# Altium schematic symbol library Capacitor - Aluminium TH.SchLib: 4591 symbols (part 19 of 27) (continued)
## UPA1E102MHD3TO (continued)
CAP ALUM 1000UF 20% 25V RADIAL; Part Number: UPA1E102MHD3TO; Manufacturer: Nichicon; TemperatureRange: -55C ~ 105C; Type: Polar; Ripple Current: 1.418A @ 120Hz; Value: 1000uF; PartId: 23201; Supplier 1: Digi-Key; Supplier Part Number 1: 493-4897-3-ND; ComponentLink1Description: Datasheet; ComponentLink1URL: http://nichicon-us.com/english/products/pdfs/e-upa.pdf; ComponentLink2Description: Digi-Key Listing; ComponentLink2URL: https://www.digikey.com/product-detail/en/nichicon/UPA1E102MHD3TO/493-4897-3-ND/3129902; Tolerance: 20%; Voltage: 25V; Price: 0.4627; Device Package: Radial, Can, 12.5mm
footprint CAP AL TH D12.5 L5 H22
pins: 1, 2

## UPA1E102MPD1TD
designator C?, comment 1000uF  (value not drawn)
CAP ALUM 1000UF 20% 25V RADIAL; Part Number: UPA1E102MPD1TD; Manufacturer: Nichicon; TemperatureRange: -55C ~ 105C; Type: Polar; Ripple Current: 1.26A @ 120Hz; Impedance: 33 mOhm; Value: 1000uF; PartId: 26035; Supplier 1: Digi-Key; Supplier Part Number 1: 493-4898-3-ND; ComponentLink1Description: Datasheet; ComponentLink1URL: http://nichicon-us.com/english/products/pdfs/e-upa.pdf; ComponentLink2Description: Digi-Key Listing; ComponentLink2URL: https://www.digikey.com/product-detail/en/nichicon/UPA1E102MPD1TD/493-4898-3-ND/3129903; Tolerance: 20%; Voltage: 25V; Price: 0.4627; Device Package: Radial, Can, 10mm
footprint CAP AL TH D10 L5 H30
pins: 1, 2

## UPA1E122MHD1TO
designator C?, comment 1200uF  (value not drawn)
CAP ALUM 1200UF 20% 25V RADIAL; Part Number: UPA1E122MHD1TO; Manufacturer: Nichicon; TemperatureRange: -55C ~ 105C; Type: Polar; Ripple Current: 1.607A @ 120Hz; Impedance: 29 mOhm; Value: 1200uF; PartId: 23485; Supplier 1: Digi-Key; Supplier Part Number 1: 493-4899-1-ND; ComponentLink1Description: Datasheet; ComponentLink1URL: http://nichicon-us.com/english/products/pdfs/e-upa.pdf; ComponentLink2Description: Digi-Key Listing; ComponentLink2URL: https://www.digikey.com/product-detail/en/nichicon/UPA1E122MHD1TO/493-4899-1-ND/3129236; Tolerance: 20%; Voltage: 25V; Price: 1.16; Device Package: Radial, Can, 12.5mm
footprint CAP AL TH D12.5 L5 H22
pins: 1, 2

## UPA1E182MHD1TO
designator C?, comment 1800uF  (value not drawn)
CAP ALUM 1800UF 20% 25V RADIAL; Part Number: UPA1E182MHD1TO; Manufacturer: Nichicon; TemperatureRange: -55C ~ 105C; Type: Polar; Ripple Current: 1.938A @ 120Hz; Impedance: 22 mOhm; Value: 1800uF; PartId: 23843; Supplier 1: Digi-Key; Supplier Part Number 1: 493-4900-3-ND; ComponentLink1Description: Datasheet; ComponentLink1URL: http://nichicon-us.com/english/products/pdfs/e-upa.pdf; ComponentLink2Description: Digi-Key Listing; ComponentLink2URL: https://www.digikey.com/product-detail/en/nichicon/UPA1E182MHD1TO/493-4900-3-ND/3129905; Tolerance: 20%; Voltage: 25V; Price: 0.5358; Device Package: Radial, Can, 12.5mm
footprint CAP AL TH D12.5 L5 H27
pins: 1, 2

## UPA1E222MHD
designator C?, comment 2200uF  (value not drawn)
CAP ALUM 2200UF 20% 25V RADIAL; Part Number: UPA1E222MHD; Manufacturer: Nichicon; TemperatureRange: -55C ~ 105C; Type: Polar; Ripple Current: 2.312A @ 120Hz; Impedance: 18 mOhm; Value: 2200uF; PartId: 24366; Supplier 1: Digi-Key; Supplier Part Number 1: 493-5433-ND; ComponentLink1Description: Datasheet; ComponentLink1URL: http://nichicon-us.com/english/products/pdfs/e-upa.pdf; ComponentLink2Description: Digi-Key Listing; ComponentLink2URL: https://www.digikey.com/product-detail/en/nichicon/UPA1E222MHD/493-5433-ND/3130438; Tolerance: 20%; Voltage: 25V; Price: 1.56; Device Package: Radial, Can, 12.5mm
footprint CAP AL TH D12.5 L5 H35.5
pins: 1, 2

## UPA1E222MHD6TN
designator C?, comment 2200uF  (value not drawn)
CAP ALUM 2200UF 20% 25V RADIAL; Part Number: UPA1E222MHD6TN; Manufacturer: Nichicon; TemperatureRange: -55C ~ 105C; Type: Polar; Ripple Current: 1.981A @ 120Hz; Impedance: 26 mOhm; Value: 2200uF; PartId: 26400; Supplier 1: Digi-Key; Supplier Part Number 1: 493-4901-3-ND; ComponentLink1Description: Datasheet; ComponentLink1URL: http://nichicon-us.com/english/products/pdfs/e-upa.pdf; ComponentLink2Description: Digi-Key Listing; ComponentLink2URL: https://www.digikey.com/product-detail/en/nichicon/UPA1E222MHD6TN/493-4901-3-ND/3129906; Tolerance: 20%; Voltage: 25V; Price: 0.9222; Device Package: Radial, Can, 16mm
footprint CAP AL TH D16 L7.5 H22
pins: 1, 2

## UPA1E332MHD1TN
designator C?, comment 3300uF  (value not drawn)
CAP ALUM 3300UF 20% 25V RADIAL; Part Number: UPA1E332MHD1TN; Manufacturer: Nichicon; TemperatureRange: -55C ~ 105C; Type: Polar; Ripple Current: 2.346A @ 120Hz; Impedance: 19 mOhm; Value: 3300uF; PartId: 26832; Supplier 1: Digi-Key; Supplier Part Number 1: 493-4904-3-ND; ComponentLink1Description: Datasheet; ComponentLink1URL: http://nichicon-us.com/english/products/pdfs/e-upa.pdf; ComponentLink2Description: Digi-Key Listing; ComponentLink2URL: https://www.digikey.com/product-detail/en/nichicon/UPA1E332MHD1TN/493-4904-3-ND/3129909; Tolerance: 20%; Voltage: 25V; Price: 0.9801; Device Package: Radial, Can, 16mm
footprint CAP AL TH D16 L7.5 H27
pins: 1, 2

## UPA1E471MPD6TD
designator C?, comment 470uF  (value not drawn)
CAP ALUM 470UF 20% 25V RADIAL; Part Number: UPA1E471MPD6TD; Manufacturer: Nichicon; TemperatureRange: -55C ~ 105C; Type: Polar; Ripple Current: 675mA @ 120Hz; Impedance: 63 mOhm; Value: 470uF; PartId: 24658; Supplier 1: Digi-Key; Supplier Part Number 1: 493-4907-3-ND; ComponentLink1Description: Datasheet; ComponentLink1URL: http://nichicon-us.com/english/products/pdfs/e-upa.pdf; ComponentLink2Description: Digi-Key Listing; ComponentLink2URL: https://www.digikey.com/product-detail/en/nichicon/UPA1E471MPD6TD/493-4907-3-ND/3129912; Tolerance: 20%; Voltage: 25V; Price: 0.2587; Device Package: Radial, Can, 10mm
footprint CAP AL TH D10 L5 H14.5
pins: 1, 2

## UPA1E561MPD6TD
designator C?, comment 560uF  (value not drawn)
CAP ALUM 560UF 20% 25V RADIAL; Part Number: UPA1E561MPD6TD; Manufacturer: Nichicon; TemperatureRange: -55C ~ 105C; Type: Polar; Ripple Current: 930mA @ 120Hz; Impedance: 49 mOhm; Value: 560uF; PartId: 25119; Supplier 1: Digi-Key; Supplier Part Number 1: 493-4910-3-ND; ComponentLink1Description: Datasheet; ComponentLink1URL: http://nichicon-us.com/english/products/pdfs/e-upa.pdf; ComponentLink2Description: Digi-Key Listing; ComponentLink2URL: https://www.digikey.com/product-detail/en/nichicon/UPA1E561MPD6TD/493-4910-3-ND/3129915; Tolerance: 20%; Voltage: 25V; Price: 0.3241; Device Package: Radial, Can, 10mm
footprint CAP AL TH D10 L5 H17.5
pins: 1, 2

## UPA1E681MPD1TD
designator C?, comment 680uF  (value not drawn)
CAP ALUM 680UF 20% 25V RADIAL; Part Number: UPA1E681MPD1TD; Manufacturer: Nichicon; TemperatureRange: -55C ~ 105C; Type: Polar; Ripple Current: 930mA @ 120Hz; Impedance: 49 mOhm; Value: 680uF; PartId: 25106; Supplier 1: Digi-Key; Supplier Part Number 1: 493-4911-3-ND; ComponentLink1Description: Datasheet; ComponentLink1URL: http://nichicon-us.com/english/products/pdfs/e-upa.pdf; ComponentLink2Description: Digi-Key Listing; ComponentLink2URL: https://www.digikey.com/product-detail/en/nichicon/UPA1E681MPD1TD/493-4911-3-ND/3129916; Tolerance: 20%; Voltage: 25V; Price: 0.2945; Device Package: Radial, Can, 10mm
footprint CAP AL TH D10 L5 H17.5
pins: 1, 2

## UPA1E821MPD1TD
designator C?, comment 820uF  (value not drawn)
CAP ALUM 820UF 20% 25V RADIAL; Part Number: UPA1E821MPD1TD; Manufacturer: Nichicon; TemperatureRange: -55C ~ 105C; Type: Polar; Ripple Current: 1.118A @ 120Hz; Impedance: 35 mOhm; Value: 820uF; PartId: 25827; Supplier 1: Digi-Key; Supplier Part Number 1: 493-4912-3-ND; ComponentLink1Description: Datasheet; ComponentLink1URL: http://nichicon-us.com/english/products/pdfs/e-upa.pdf; ComponentLink2Description: Digi-Key Listing; ComponentLink2URL: https://www.digikey.com/product-detail/en/nichicon/UPA1E821MPD1TD/493-4912-3-ND/3129917; Tolerance: 20%; Voltage: 25V; Price: 0.3447; Device Package: Radial, Can, 10mm
footprint CAP AL TH D10 L5 H22
pins: 1, 2

## UPA1V102MHD1TO
designator C?, comment 1000uF  (value not drawn)
CAP ALUM 1000UF 20% 35V RADIAL; Part Number: UPA1V102MHD1TO; Manufacturer: Nichicon; TemperatureRange: -55C ~ 105C; Type: Polar; Ripple Current: 1.418A @ 120Hz; Impedance: 29 mOhm; Value: 1000uF; PartId: 23205; Supplier 1: Digi-Key; Supplier Part Number 1: 493-4913-3-ND; ComponentLink1Description: Datasheet; ComponentLink1URL: http://nichicon-us.com/english/products/pdfs/e-upa.pdf; ComponentLink2Description: Digi-Key Listing; ComponentLink2URL: https://www.digikey.com/product-detail/en/nichicon/UPA1V102MHD1TO/493-4913-3-ND/3129918; Tolerance: 20%; Voltage: 35V; Price: 0.4945; Device Package: Radial, Can, 12.5mm
footprint CAP AL TH D12.5 L5 H22
pins: 1, 2

## UPA1V122MHD1TO
designator C?, comment 1200uF  (value not drawn)
CAP ALUM 1200UF 20% 35V RADIAL; Part Number: UPA1V122MHD1TO; Manufacturer: Nichicon; TemperatureRange: -55C ~ 105C; Type: Polar; Ripple Current: 1.938A @ 120Hz; Impedance: 22 mOhm; Value: 1200uF; PartId: 23846; Supplier 1: Digi-Key; Supplier Part Number 1: 493-4914-3-ND; ComponentLink1Description: Datasheet; ComponentLink1URL: http://nichicon-us.com/english/products/pdfs/e-upa.pdf; ComponentLink2Description: Digi-Key Listing; ComponentLink2URL: https://www.digikey.com/product-detail/en/nichicon/UPA1V122MHD1TO/493-4914-3-ND/3129919; Tolerance: 20%; Voltage: 35V; Price: 0.5584; Device Package: Radial, Can, 12.5mm
footprint CAP AL TH D12.5 L5 H27
pins: 1, 2

## UPA1V152MHD
designator C?, comment 1500uF  (value not drawn)
CAP ALUM 1500UF 20% 35V RADIAL; Part Number: UPA1V152MHD; Manufacturer: Nichicon; TemperatureRange: -55C ~ 105C; Type: Polar; Ripple Current: 2.312A @ 120Hz; Impedance: 18 mOhm; Value: 1500uF; PartId: 24364; Supplier 1: Digi-Key; Supplier Part Number 1: 493-5435-ND; ComponentLink1Description: Datasheet; ComponentLink1URL: http://nichicon-us.com/english/products/pdfs/e-upa.pdf; ComponentLink2Description: Digi-Key Listing; ComponentLink2URL: https://www.digikey.com/product-detail/en/nichicon/UPA1V152MHD/493-5435-ND/3130440; Tolerance: 20%; Voltage: 35V; Price: 1.56; Device Package: Radial, Can, 12.5mm
footprint CAP AL TH D12.5 L5 H35.5
pins: 1, 2

## UPA1V222MHD1TN
designator C?, comment 2200uF  (value not drawn)
CAP ALUM 2200UF 20% 35V RADIAL; Part Number: UPA1V222MHD1TN; Manufacturer: Nichicon; TemperatureRange: -55C ~ 105C; Type: Polar; Ripple Current: 2.346A @ 120Hz; Impedance: 19 mOhm; Value: 2200uF; PartId: 26843; Supplier 1: Digi-Key; Supplier Part Number 1: 493-4917-3-ND; ComponentLink1Description: Datasheet; ComponentLink1URL: http://nichicon-us.com/english/products/pdfs/e-upa.pdf; ComponentLink2Description: Digi-Key Listing; ComponentLink2URL: https://www.digikey.com/product-detail/en/nichicon/UPA1V222MHD1TN/493-4917-3-ND/3129922; Tolerance: 20%; Voltage: 35V; Price: 1.0285; Device Package: Radial, Can, 16mm
footprint CAP AL TH D16 L7.5 H27
pins: 1, 2

## UPA1V271MPD6TD
designator C?, comment 270uF  (value not drawn)
CAP ALUM 270UF 20% 35V RADIAL; Part Number: UPA1V271MPD6TD; Manufacturer: Nichicon; TemperatureRange: -55C ~ 105C; Type: Polar; Ripple Current: 585mA @ 120Hz; Impedance: 63 mOhm; Value: 270uF; PartId: 24656; Supplier 1: Digi-Key; Supplier Part Number 1: 493-4920-3-ND; ComponentLink1Description: Datasheet; ComponentLink1URL: http://nichicon-us.com/english/products/pdfs/e-upa.pdf; ComponentLink2Description: Digi-Key Listing; ComponentLink2URL: https://www.digikey.com/product-detail/en/nichicon/UPA1V271MPD6TD/493-4920-3-ND/3129925; Tolerance: 20%; Voltage: 35V; Price: 0.2572; Device Package: Radial, Can, 10mm
footprint CAP AL TH D10 L5 H14.5
pins: 1, 2

## UPA1V272MHD
designator C?, comment 2700uF  (value not drawn)
CAP ALUM 2700UF 20% 35V RADIAL; Part Number: UPA1V272MHD; Manufacturer: Nichicon; TemperatureRange: -55C ~ 105C; Type: Polar; Ripple Current: 2.389A @ 120Hz; Impedance: 17 mOhm; Value: 2700uF; PartId: 27218; Supplier 1: Digi-Key; Supplier Part Number 1: 493-5437-ND; ComponentLink1Description: Datasheet; ComponentLink1URL: http://nichicon-us.com/english/products/pdfs/e-upa.pdf; ComponentLink2Description: Digi-Key Listing; ComponentLink2URL: https://www.digikey.com/product-detail/en/nichicon/UPA1V272MHD/493-5437-ND/3130442; Tolerance: 20%; Voltage: 35V; Price: 2.31; Device Package: Radial, Can, 16mm
footprint CAP AL TH D16 L7.5 H33.5
pins: 1, 2

## UPA1V391MPD6TD
designator C?, comment 390uF  (value not drawn)
CAP ALUM 390UF 20% 35V RADIAL; Part Number: UPA1V391MPD6TD; Manufacturer: Nichicon; TemperatureRange: -55C ~ 105C; Type: Polar; Ripple Current: 930mA @ 120Hz; Impedance: 49 mOhm; Value: 390uF; PartId: 25104; Supplier 1: Digi-Key; Supplier Part Number 1: 493-4923-3-ND; ComponentLink1Description: Datasheet; ComponentLink1URL: http://nichicon-us.com/english/products/pdfs/e-upa.pdf; ComponentLink2Description: Digi-Key Listing; ComponentLink2URL: https://www.digikey.com/product-detail/en/nichicon/UPA1V391MPD6TD/493-4923-3-ND/3129928; Tolerance: 20%; Voltage: 35V; Price: 0.2945; Device Package: Radial, Can, 10mm
footprint CAP AL TH D10 L5 H17.5
pins: 1, 2

## UPA1V561MPD1TD
designator C?, comment 560uF  (value not drawn)
CAP ALUM 560UF 20% 35V RADIAL; Part Number: UPA1V561MPD1TD; Manufacturer: Nichicon; TemperatureRange: -55C ~ 105C; Type: Polar; Ripple Current: 1.118A @ 120Hz; Impedance: 35 mOhm; Value: 560uF; PartId: 25826; Supplier 1: Digi-Key; Supplier Part Number 1: 493-4924-3-ND; ComponentLink1Description: Datasheet; ComponentLink1URL: http://nichicon-us.com/english/products/pdfs/e-upa.pdf; ComponentLink2Description: Digi-Key Listing; ComponentLink2URL: https://www.digikey.com/product-detail/en/nichicon/UPA1V561MPD1TD/493-4924-3-ND/3129929; Tolerance: 20%; Voltage: 35V; Price: 0.3447; Device Package: Radial, Can, 10mm
footprint CAP AL TH D10 L5 H22
pins: 1, 2

## UPA1V681MPD1TD
designator C?, comment 680uF  (value not drawn)
CAP ALUM 680UF 20% 35V RADIAL; Part Number: UPA1V681MPD1TD; Manufacturer: Nichicon; TemperatureRange: -55C ~ 105C; Type: Polar; Ripple Current: 1.26A @ 120Hz; Impedance: 33 mOhm; Value: 680uF; PartId: 26026; Supplier 1: Digi-Key; Supplier Part Number 1: 493-4925-3-ND; ComponentLink1Description: Datasheet; ComponentLink1URL: http://nichicon-us.com/english/products/pdfs/e-upa.pdf; ComponentLink2Description: Digi-Key Listing; ComponentLink2URL: https://www.digikey.com/product-detail/en/nichicon/UPA1V681MPD1TD/493-4925-3-ND/3129930; Tolerance: 20%; Voltage: 35V; Price: 0.4017; Device Package: Radial, Can, 10mm
footprint CAP AL TH D10 L5 H30
pins: 1, 2

## UPA1V821MHD1TO
designator C?, comment 820uF  (value not drawn)
CAP ALUM 820UF 20% 35V RADIAL; Part Number: UPA1V821MHD1TO; Manufacturer: Nichicon; TemperatureRange: -55C ~ 105C; Type: Polar; Ripple Current: 1.418A @ 120Hz; Impedance: 29 mOhm; Value: 820uF; PartId: 23200; Supplier 1: Digi-Key; Supplier Part Number 1: 493-4926-3-ND; ComponentLink1Description: Datasheet; ComponentLink1URL: http://nichicon-us.com/english/products/pdfs/e-upa.pdf; ComponentLink2Description: Digi-Key Listing; ComponentLink2URL: https://www.digikey.com/product-detail/en/nichicon/UPA1V821MHD1TO/493-4926-3-ND/3129931; Tolerance: 20%; Voltage: 35V; Price: 0.4627; Device Package: Radial, Can, 12.5mm
footprint CAP AL TH D12.5 L5 H22
pins: 1, 2

## UPJ0J102MHD6TO
designator C?, comment 1000uF  (value not drawn)
CAP ALUM 1000UF 20% 6.3V RADIAL; Part Number: UPJ0J102MHD6TO; Manufacturer: Nichicon; TemperatureRange: -55C ~ 105C; Type: Polar; Ripple Current: 765mA @ 120Hz; Impedance: 130 mOhm; Value: 1000uF; PartId: 22724; Supplier 1: Digi-Key; Supplier Part Number 1: 493-11914-1-ND; ComponentLink1Description: Datasheet; ComponentLink1URL: http://nichicon-us.com/english/products/pdfs/e-upj.pdf; ComponentLink2Description: Digi-Key Listing; ComponentLink2URL: https://www.digikey.com/product-detail/en/nichicon/UPJ0J102MHD6TO/493-11914-1-ND/4319393; Tolerance: 20%; Voltage: 6.3V; Price: 0; Device Package: Radial, Can, 12.5mm
footprint CAP AL TH D12.5 L5 H16.5
pins: 1, 2

## UPJ0J122MHD6TO
designator C?, comment 1200uF  (value not drawn)
CAP ALUM 1200UF 20% 6.3V RADIAL; Part Number: UPJ0J122MHD6TO; Manufacturer: Nichicon; TemperatureRange: -55C ~ 105C; Type: Polar; Ripple Current: 835mA @ 120Hz; Impedance: 120 mOhm; Value: 1200uF; PartId: 22730; Supplier 1: Digi-Key; Supplier Part Number 1: 493-4970-1-ND; ComponentLink1Description: Datasheet; ComponentLink1URL: http://nichicon-us.com/english/products/pdfs/e-upj.pdf; ComponentLink2Description: Digi-Key Listing; ComponentLink2URL: https://www.digikey.com/product-detail/en/nichicon/UPJ0J122MHD6TO/493-4970-1-ND/3129307; Tolerance: 20%; Voltage: 6.3V; Price: 0; Device Package: Radial, Can, 12.5mm
footprint CAP AL TH D12.5 L5 H16.5
pins: 1, 2

## UPJ0J152MHD6TO
designator C?, comment 1500uF  (value not drawn)
CAP ALUM 1500UF 20% 6.3V RADIAL; Part Number: UPJ0J152MHD6TO; Manufacturer: Nichicon; TemperatureRange: -55C ~ 105C; Type: Polar; Ripple Current: 915mA @ 120Hz; Impedance: 100 mOhm; Value: 1500uF; PartId: 22750; Supplier 1: Digi-Key; Supplier Part Number 1: 493-4973-1-ND; ComponentLink1Description: Datasheet; ComponentLink1URL: http://nichicon-us.com/english/products/pdfs/e-upj.pdf; ComponentLink2Description: Digi-Key Listing; ComponentLink2URL: https://www.digikey.com/product-detail/en/nichicon/UPJ0J152MHD6TO/493-4973-1-ND/3129310; Tolerance: 20%; Voltage: 6.3V; Price: 0; Device Package: Radial, Can, 12.5mm
footprint CAP AL TH D12.5 L5 H16.5
pins: 1, 2

## UPJ0J152MPD
designator C?, comment 1500uF  (value not drawn)
CAP ALUM 1500UF 20% 6.3V RADIAL; Part Number: UPJ0J152MPD; Manufacturer: Nichicon; TemperatureRange: -55C ~ 105C; Type: Polar; Ripple Current: 1.09A @ 120Hz; Impedance: 84 mOhm; Value: 1500uF; PartId: 26059; Supplier 1: Digi-Key; Supplier Part Number 1: 493-14368-ND; ComponentLink1Description: Datasheet; ComponentLink1URL: http://nichicon-us.com/english/products/pdfs/e-upj.pdf; ComponentLink2Description: Digi-Key Listing; ComponentLink2URL: https://www.digikey.com/product-detail/en/nichicon/UPJ0J152MPD/493-14368-ND/2599000; Tolerance: 20%; Voltage: 6.3V; Price: 0.67; Device Package: Radial, Can, 10mm
footprint CAP AL TH D10 L5 H30
pins: 1, 2

## UPJ0J182MHD6TN
designator C?, comment 1800uF  (value not drawn)
CAP ALUM 1800UF 20% 6.3V RADIAL; Part Number: UPJ0J182MHD6TN; Manufacturer: Nichicon; TemperatureRange: -55C ~ 105C; Type: Polar; Ripple Current: 1.14A @ 120Hz; Impedance: 84 mOhm; Value: 1800uF; PartId: 26230; Supplier 1: Digi-Key; Supplier Part Number 1: 493-4974-3-ND; ComponentLink1Description: Datasheet; ComponentLink1URL: http://nichicon-us.com/english/products/pdfs/e-upj.pdf; ComponentLink2Description: Digi-Key Listing; ComponentLink2URL: https://www.digikey.com/product-detail/en/nichicon/UPJ0J182MHD6TN/493-4974-3-ND/3129979; Tolerance: 20%; Voltage: 6.3V; Price: 0.3876; Device Package: Radial, Can, 16mm
footprint CAP AL TH D16 L7.5 H16.5
pins: 1, 2

## UPJ0J222MHD6TN
designator C?, comment 2200uF  (value not drawn)
CAP ALUM 2200UF 20% 6.3V RADIAL; Part Number: UPJ0J222MHD6TN; Manufacturer: Nichicon; TemperatureRange: -55C ~ 105C; Type: Polar; Ripple Current: 1.2A @ 120Hz; Impedance: 78 mOhm; Value: 2200uF; PartId: 26234; Supplier 1: Digi-Key; Supplier Part Number 1: 493-4975-3-ND; ComponentLink1Description: Datasheet; ComponentLink1URL: http://nichicon-us.com/english/products/pdfs/e-upj.pdf; ComponentLink2Description: Digi-Key Listing; ComponentLink2URL: https://www.digikey.com/product-detail/en/nichicon/UPJ0J222MHD6TN/493-4975-3-ND/3129980; Tolerance: 20%; Voltage: 6.3V; Price: 0.4095; Device Package: Radial, Can, 16mm
footprint CAP AL TH D16 L7.5 H16.5
pins: 1, 2

## UPJ0J272MHD1TO
designator C?, comment 2700uF  (value not drawn)
CAP ALUM 2700UF 20% 6.3V RADIAL; Part Number: UPJ0J272MHD1TO; Manufacturer: Nichicon; TemperatureRange: -55C ~ 105C; Type: Polar; Ripple Current: 1.43A @ 120Hz; Impedance: 51 mOhm; Value: 2700uF; PartId: 23623; Supplier 1: Digi-Key; Supplier Part Number 1: 493-4976-3-ND; ComponentLink1Description: Datasheet; ComponentLink1URL: http://nichicon-us.com/english/products/pdfs/e-upj.pdf; ComponentLink2Description: Digi-Key Listing; ComponentLink2URL: https://www.digikey.com/product-detail/en/nichicon/UPJ0J272MHD1TO/493-4976-3-ND/3129981; Tolerance: 20%; Voltage: 6.3V; Price: 0.3389; Device Package: Radial, Can, 12.5mm
footprint CAP AL TH D12.5 L5 H26.5
pins: 1, 2

## UPJ0J332MHD1TO
designator C?, comment 3300uF  (value not drawn)
CAP ALUM 3300UF 20% 6.3V RADIAL; Part Number: UPJ0J332MHD1TO; Manufacturer: Nichicon; TemperatureRange: -55C ~ 105C; Type: Polar; Ripple Current: 1.53A @ 120Hz; Impedance: 45 mOhm; Value: 3300uF; PartId: 23942; Supplier 1: Digi-Key; Supplier Part Number 1: 493-12101-1-ND; ComponentLink1Description: Datasheet; ComponentLink1URL: http://nichicon-us.com/english/products/pdfs/e-upj.pdf; ComponentLink2Description: Digi-Key Listing; ComponentLink2URL: https://www.digikey.com/product-detail/en/nichicon/UPJ0J332MHD1TO/493-12101-1-ND/4319400; Tolerance: 20%; Voltage: 6.3V; Price: 0.97; Device Package: Radial, Can, 12.5mm
footprint CAP AL TH D12.5 L5 H27
pins: 1, 2

## UPJ0J392MHD
designator C?, comment 3900uF  (value not drawn)
CAP ALUM 3900UF 20% 6.3V RADIAL; Part Number: UPJ0J392MHD; Manufacturer: Nichicon; TemperatureRange: -55C ~ 105C; Type: Polar; Ripple Current: 1.71A @ 120Hz; Impedance: 37 mOhm; Value: 3900uF; PartId: 24202; Supplier 1: Digi-Key; Supplier Part Number 1: 493-5514-ND; ComponentLink1Description: Datasheet; ComponentLink1URL: http://nichicon-us.com/english/products/pdfs/e-upj.pdf; ComponentLink2Description: Digi-Key Listing; ComponentLink2URL: https://www.digikey.com/product-detail/en/nichicon/UPJ0J392MHD/493-5514-ND/2599015; Tolerance: 20%; Voltage: 6.3V; Price: 0.89; Device Package: Radial, Can, 12.5mm
footprint CAP AL TH D12.5 L5 H35.5
pins: 1, 2

## UPJ0J392MHD6TN
designator C?, comment 3900uF  (value not drawn)
CAP ALUM 3900UF 20% 6.3V RADIAL; Part Number: UPJ0J392MHD6TN; Manufacturer: Nichicon; TemperatureRange: -55C ~ 105C; Type: Polar; Ripple Current: 1.54A @ 120Hz; Impedance: 56 mOhm; Value: 3900uF; PartId: 26357; Supplier 1: Digi-Key; Supplier Part Number 1: 493-4979-3-ND; ComponentLink1Description: Datasheet; ComponentLink1URL: http://nichicon-us.com/english/products/pdfs/e-upj.pdf; ComponentLink2Description: Digi-Key Listing; ComponentLink2URL: https://www.digikey.com/product-detail/en/nichicon/UPJ0J392MHD6TN/493-4979-3-ND/3129984; Tolerance: 20%; Voltage: 6.3V; Price: 0.5151; Device Package: Radial, Can, 16mm
footprint CAP AL TH D16 L7.5 H22
pins: 1, 2

## UPJ0J471MPD6TD
designator C?, comment 470uF  (value not drawn)
CAP ALUM 470UF 20% 6.3V RADIAL; Part Number: UPJ0J471MPD6TD; Manufacturer: Nichicon; TemperatureRange: -55C ~ 105C; Type: Polar; Ripple Current: 455mA @ 120Hz; Impedance: 230 mOhm; Value: 470uF; PartId: 24503; Supplier 1: Digi-Key; Supplier Part Number 1: 493-4980-3-ND; ComponentLink1Description: Datasheet; ComponentLink1URL: http://nichicon-us.com/english/products/pdfs/e-upj.pdf; ComponentLink2Description: Digi-Key Listing; ComponentLink2URL: https://www.digikey.com/product-detail/en/nichicon/UPJ0J471MPD6TD/493-4980-3-ND/3129985; Tolerance: 20%; Voltage: 6.3V; Price: 0.1149; Device Package: Radial, Can, 10mm
footprint CAP AL TH D10 L5 H14.5
pins: 1, 2

## UPJ0J561MPD6TD
designator C?, comment 560uF  (value not drawn)
CAP ALUM 560UF 20% 6.3V RADIAL; Part Number: UPJ0J561MPD6TD; Manufacturer: Nichicon; TemperatureRange: -55C ~ 105C; Type: Polar; Ripple Current: 485mA @ 120Hz; Impedance: 210 mOhm; Value: 560uF; PartId: 24791; Supplier 1: Digi-Key; Supplier Part Number 1: 493-4983-1-ND; ComponentLink1Description: Datasheet; ComponentLink1URL: http://nichicon-us.com/english/products/pdfs/e-upj.pdf; ComponentLink2Description: Digi-Key Listing; ComponentLink2URL: https://www.digikey.com/product-detail/en/nichicon/UPJ0J561MPD6TD/493-4983-1-ND/3129320; Tolerance: 20%; Voltage: 6.3V; Price: 0.44; Device Package: Radial, Can, 10mm
footprint CAP AL TH D10 L5 H14.5
pins: 1, 2

## UPJ0J681MPD6TD
designator C?, comment 680uF  (value not drawn)
CAP ALUM 680UF 20% 6.3V RADIAL; Part Number: UPJ0J681MPD6TD; Manufacturer: Nichicon; TemperatureRange: -55C ~ 105C; Type: Polar; Ripple Current: 580mA @ 120Hz; Impedance: 180 mOhm; Value: 680uF; PartId: 24990; Supplier 1: Digi-Key; Supplier Part Number 1: 493-4986-3-ND; ComponentLink1Description: Datasheet; ComponentLink1URL: http://nichicon-us.com/english/products/pdfs/e-upj.pdf; ComponentLink2Description: Digi-Key Listing; ComponentLink2URL: https://www.digikey.com/product-detail/en/nichicon/UPJ0J681MPD6TD/493-4986-3-ND/3129991; Tolerance: 20%; Voltage: 6.3V; Price: 0.1251; Device Package: Radial, Can, 10mm
footprint CAP AL TH D10 L5 H17.5
pins: 1, 2

## UPJ0J682MHD
designator C?, comment 6800uF  (value not drawn)
CAP ALUM 6800UF 20% 6.3V RADIAL; Part Number: UPJ0J682MHD; Manufacturer: Nichicon; TemperatureRange: -55C ~ 105C; Type: Polar; Ripple Current: 2.13A @ 120Hz; Impedance: 29 mOhm; Value: 6800uF; PartId: 26986; Supplier 1: Digi-Key; Supplier Part Number 1: 493-5516-ND; ComponentLink1Description: Datasheet; ComponentLink1URL: http://nichicon-us.com/english/products/pdfs/e-upj.pdf; ComponentLink2Description: Digi-Key Listing; ComponentLink2URL: https://www.digikey.com/product-detail/en/nichicon/UPJ0J682MHD/493-5516-ND/2599027; Tolerance: 20%; Voltage: 6.3V; Price: 1.25; Device Package: Radial, Can, 16mm
footprint CAP AL TH D16 L7.5 H33.5
pins: 1, 2

## UPJ0J822MHD
designator C?, comment 8200uF  (value not drawn)
CAP ALUM 8200UF 20% 6.3V RADIAL; Part Number: UPJ0J822MHD; Manufacturer: Nichicon; TemperatureRange: -55C ~ 105C; Type: Polar; Ripple Current: 2.29A @ 120Hz; Impedance: 27 mOhm; Value: 8200uF; PartId: 27316; Supplier 1: Digi-Key; Supplier Part Number 1: 493-5517-ND; ComponentLink1Description: Datasheet; ComponentLink1URL: http://nichicon-us.com/english/products/pdfs/e-upj.pdf; ComponentLink2Description: Digi-Key Listing; ComponentLink2URL: https://www.digikey.com/product-detail/en/nichicon/UPJ0J822MHD/493-5517-ND/2599031; Tolerance: 20%; Voltage: 6.3V; Price: 1.47; Device Package: Radial, Can, 16mm
footprint CAP AL TH D16 L7.5 H37
pins: 1, 2

## UPJ1A102MHD6TO
designator C?, comment 1000uF  (value not drawn)
CAP ALUM 1000UF 20% 10V RADIAL; Part Number: UPJ1A102MHD6TO; Manufacturer: Nichicon; TemperatureRange: -55C ~ 105C; Type: Polar; Ripple Current: 895mA @ 120Hz; Impedance: 100 mOhm; Value: 1000uF; PartId: 22742; Supplier 1: Digi-Key; Supplier Part Number 1: 493-4988-1-ND; ComponentLink1Description: Datasheet; ComponentLink1URL: http://nichicon-us.com/english/products/pdfs/e-upj.pdf; ComponentLink2Description: Digi-Key Listing; ComponentLink2URL: https://www.digikey.com/product-detail/en/nichicon/UPJ1A102MHD6TO/493-4988-1-ND/3129325; Tolerance: 20%; Voltage: 10V; Price: 0; Device Package: Radial, Can, 12.5mm
footprint CAP AL TH D12.5 L5 H16.5
pins: 1, 2

## UPJ1A102MPD1TD
designator C?, comment 1000uF  (value not drawn)
CAP ALUM 1000UF 20% 10V RADIAL; Part Number: UPJ1A102MPD1TD; Manufacturer: Nichicon; TemperatureRange: -55C ~ 105C; Type: Polar; Ripple Current: 915mA @ 120Hz; Impedance: 96 mOhm; Value: 1000uF; PartId: 25731; Supplier 1: Digi-Key; Supplier Part Number 1: 493-11861-3-ND; ComponentLink1Description: Datasheet; ComponentLink1URL: http://nichicon-us.com/english/products/pdfs/e-upj.pdf; ComponentLink2Description: Digi-Key Listing; ComponentLink2URL: https://www.digikey.com/product-detail/en/nichicon/UPJ1A102MPD1TD/493-11861-3-ND/4321004; Tolerance: 20%; Voltage: 10V; Price: 0.1718; Device Package: Radial, Can, 10mm
footprint CAP AL TH D10 L5 H22
pins: 1, 2

## UPJ1A122MHD6TO
designator C?, comment 1200uF  (value not drawn)
CAP ALUM 1200UF 20% 10V RADIAL; Part Number: UPJ1A122MHD6TO; Manufacturer: Nichicon; TemperatureRange: -55C ~ 105C; Type: Polar; Ripple Current: 930mA @ 120Hz; Impedance: 96 mOhm; Value: 1200uF; PartId: 22752; Supplier 1: Digi-Key; Supplier Part Number 1: 493-4990-1-ND; ComponentLink1Description: Datasheet; ComponentLink1URL: http://nichicon-us.com/english/products/pdfs/e-upj.pdf; ComponentLink2Description: Digi-Key Listing; ComponentLink2URL: https://www.digikey.com/product-detail/en/nichicon/UPJ1A122MHD6TO/493-4990-1-ND/3129327; Tolerance: 20%; Voltage: 10V; Price: 0; Device Package: Radial, Can, 12.5mm
footprint CAP AL TH D12.5 L5 H16.5
pins: 1, 2

## UPJ1A122MPD1TD
designator C?, comment 1200uF  (value not drawn)
CAP ALUM 1200UF 20% 10V RADIAL; Part Number: UPJ1A122MPD1TD; Manufacturer: Nichicon; TemperatureRange: -55C ~ 105C; Type: Polar; Ripple Current: 1.12A @ 120Hz; Impedance: 78 mOhm; Value: 1200uF; PartId: 26006; Supplier 1: Digi-Key; Supplier Part Number 1: 493-4991-3-ND; ComponentLink1Description: Datasheet; ComponentLink1URL: http://nichicon-us.com/english/products/pdfs/e-upj.pdf; ComponentLink2Description: Digi-Key Listing; ComponentLink2URL: https://www.digikey.com/product-detail/en/nichicon/UPJ1A122MPD1TD/493-4991-3-ND/3129996; Tolerance: 20%; Voltage: 10V; Price: 0.2528; Device Package: Radial, Can, 10mm
footprint CAP AL TH D10 L5 H30
pins: 1, 2

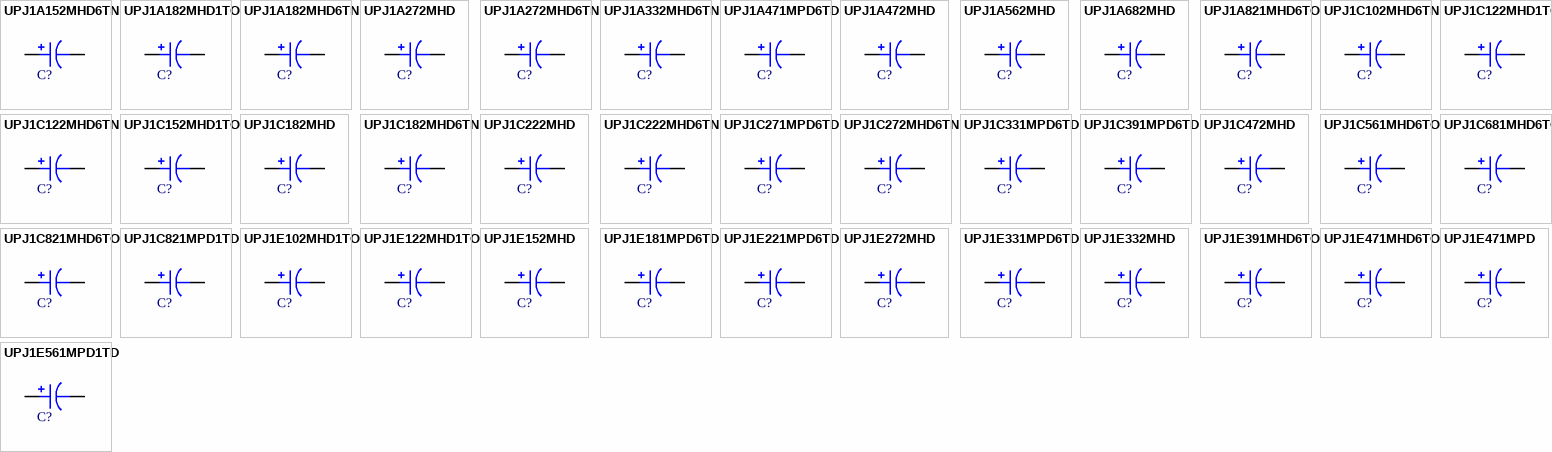
[diagram p81: symbols UPJ1A152MHD6TN to UPJ1E561MPD1TD]

## UPJ1A152MHD6TN
designator C?, comment 1500uF  (value not drawn)
CAP ALUM 1500UF 20% 10V RADIAL; Part Number: UPJ1A152MHD6TN; Manufacturer: Nichicon; TemperatureRange: -55C ~ 105C; Type: Polar; Ripple Current: 1.19A @ 120Hz; Impedance: 78 mOhm; Value: 1500uF; PartId: 22760; Supplier 1: Digi-Key; Supplier Part Number 1: 493-12073-1-ND; ComponentLink1Description: Datasheet; ComponentLink1URL: http://nichicon-us.com/english/products/pdfs/e-upj.pdf; ComponentLink2Description: Digi-Key Listing; ComponentLink2URL: https://www.digikey.com/product-detail/en/nichicon/UPJ1A152MHD6TN/493-12073-1-ND/4319407; Tolerance: 20%; Voltage: 10V; Price: 0; Device Package: Radial, Can, 12.5mm
footprint CAP AL TH D12.5 L5 H16.5
pins: 1, 2

## UPJ1A182MHD1TO
designator C?, comment 1800uF  (value not drawn)
CAP ALUM 1800UF 20% 10V RADIAL; Part Number: UPJ1A182MHD1TO; Manufacturer: Nichicon; TemperatureRange: -55C ~ 105C; Type: Polar; Ripple Current: 1.32A @ 120Hz; Impedance: 57 mOhm; Value: 1800uF; PartId: 22952; Supplier 1: Digi-Key; Supplier Part Number 1: 493-4994-1-ND; ComponentLink1Description: Datasheet; ComponentLink1URL: http://nichicon-us.com/english/products/pdfs/e-upj.pdf; ComponentLink2Description: Digi-Key Listing; ComponentLink2URL: https://www.digikey.com/product-detail/en/nichicon/UPJ1A182MHD1TO/493-4994-1-ND/3129331; Tolerance: 20%; Voltage: 10V; Price: 0; Device Package: Radial, Can, 12.5mm
footprint CAP AL TH D12.5 L5 H21.5
pins: 1, 2

## UPJ1A182MHD6TN
designator C?, comment 1800uF  (value not drawn)
CAP ALUM 1800UF 20% 10V RADIAL; Part Number: UPJ1A182MHD6TN; Manufacturer: Nichicon; TemperatureRange: -55C ~ 105C; Type: Polar; Ripple Current: 1.27A @ 120Hz; Impedance: 72 mOhm; Value: 1800uF; PartId: 26225; Supplier 1: Digi-Key; Supplier Part Number 1: 493-4995-3-ND; ComponentLink1Description: Datasheet; ComponentLink1URL: http://nichicon-us.com/english/products/pdfs/e-upj.pdf; ComponentLink2Description: Digi-Key Listing; ComponentLink2URL: https://www.digikey.com/product-detail/en/nichicon/UPJ1A182MHD6TN/493-4995-3-ND/3130000; Tolerance: 20%; Voltage: 10V; Price: 0.2877; Device Package: Radial, Can, 16mm
footprint CAP AL TH D16 L7.5 H16.5
pins: 1, 2

## UPJ1A272MHD
designator C?, comment 2700uF  (value not drawn)
CAP ALUM 2700UF 20% 10V RADIAL; Part Number: UPJ1A272MHD; Manufacturer: Nichicon; TemperatureRange: -55C ~ 105C; Type: Polar; Ripple Current: 1.74A @ 120Hz; Impedance: 36 mOhm; Value: 2700uF; PartId: 24209; Supplier 1: Digi-Key; Supplier Part Number 1: 493-5519-ND; ComponentLink1Description: Datasheet; ComponentLink1URL: http://nichicon-us.com/english/products/pdfs/e-upj.pdf; ComponentLink2Description: Digi-Key Listing; ComponentLink2URL: https://www.digikey.com/product-detail/en/nichicon/UPJ1A272MHD/493-5519-ND/2599050; Tolerance: 20%; Voltage: 10V; Price: 0.92; Device Package: Radial, Can, 12.5mm
footprint CAP AL TH D12.5 L5 H35.5
pins: 1, 2

## UPJ1A272MHD6TN
designator C?, comment 2700uF  (value not drawn)
CAP ALUM 2700UF 20% 10V RADIAL; Part Number: UPJ1A272MHD6TN; Manufacturer: Nichicon; TemperatureRange: -55C ~ 105C; Type: Polar; Ripple Current: 1.56A @ 120Hz; Impedance: 51 mOhm; Value: 2700uF; PartId: 26349; Supplier 1: Digi-Key; Supplier Part Number 1: 493-4999-3-ND; ComponentLink1Description: Datasheet; ComponentLink1URL: http://nichicon-us.com/english/products/pdfs/e-upj.pdf; ComponentLink2Description: Digi-Key Listing; ComponentLink2URL: https://www.digikey.com/product-detail/en/nichicon/UPJ1A272MHD6TN/493-4999-3-ND/3130004; Tolerance: 20%; Voltage: 10V; Price: 0.4519; Device Package: Radial, Can, 16mm
footprint CAP AL TH D16 L7.5 H22
pins: 1, 2

## UPJ1A332MHD6TN
designator C?, comment 3300uF  (value not drawn)